# Altium footprint library 模块.PcbLib: 20 footprints (part 2 of 2)
Each footprint in its own frame and in the unit in brackets; x right, y up, seen from the top. Pads: shape width x height; smd on the part's side, far side on the other; paste and mask are expansions set on the pad; w line width, h text height; cw(c..) or ccw(c..) is an arc to the next point about the centre after c.
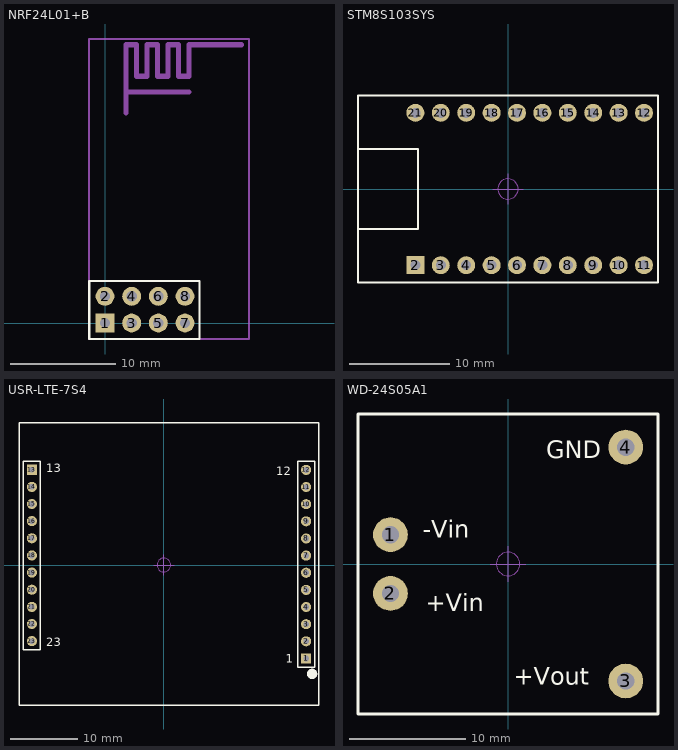
[diagram p1: the footprints below, top view; thin cyan lines are the x and y axes]

## NRF24L01+B [mm] "2.4G无线模块"
pads (8):
  rect 1.8x1.8 hole 1: 1(0,0)
  round 1.8 hole 1: 2(0,2.54) 3(2.54,0) 4(2.54,2.54) 5(5.08,0) 6(5.08,2.54) 7(7.62,0) 8(7.62,2.54)
Top Overlay:
  lines w0.203: -1.5,-1.5 -1.5,4 9,4 9,-1.524 -1.476,-1.524 -1.5,-1.5
Mechanical 15:
  lines w0.203: -1.524,-1.524 13.716,-1.524 13.716,27.051 -1.524,27.051 -1.524,-1.524
  lines w0.5: 2,20 2,26.5 3,26.5 3,23.5 4,23.5 4,26.5 5,26.5 5,23.5 6,23.5 6,26.5 7,26.5 7,23.5 8,23.5 8,26.5 13,26.5 ; 2,22 8,22
3D body: height 15.44, standoff -3.03, extent -1.5,-1.5 13.7,27

## STM8S103SYS [mm] "STM8S103核心板"
pads (20):
  rect 1.8x1.8 hole 1 unplated: 2(-9.26,-7.62)
  round 1.8 hole 1 unplated: 3(-6.72,-7.62) 4(-4.18,-7.62) 5(-1.64,-7.62) 6(0.9,-7.62) 7(3.44,-7.62) 8(5.98,-7.62) 9(8.52,-7.62) 10(11.06,-7.62) 11(13.6,-7.62) 12(13.6,7.62) 13(11.06,7.62) 14(8.52,7.62) 15(5.98,7.62) 16(3.44,7.62) 17(0.9,7.62) 18(-1.64,7.62) 19(-4.18,7.62) 20(-6.72,7.62) 21(-9.26,7.62)
Top Overlay:
  lines w0.203: -15,-4 -9,-4 -9,4 -15,4 ; -15,-9.35 15,-9.35 15,9.35 -15,9.35 -15,-9.35
Mechanical 15:
  circle w0.1: c0,0 r1.016
  lines w0.1: -1.524,0 1.524,0 ; 0,-1.524 0,1.524
3D body: height 6.33, standoff -6.01, extent -15,-9.35 15,9.35

## USR-LTE-7S4 [mm] "全网通4G DTU透传模块"
pads (23):
  rect 1.5x1.5 hole 0.85: 1(21.082,-13.843) 13(-19.558,14.122)
  round 1.5 hole 0.85: 2(21.082,-11.303) 3(21.082,-8.763) 4(21.082,-6.223) 5(21.082,-3.683) 6(21.082,-1.143) 7(21.082,1.397) 8(21.082,3.937) 9(21.082,6.477) 10(21.082,9.017) 11(21.082,11.557) 12(21.082,14.097) 14(-19.558,11.582) 15(-19.558,9.042) 16(-19.558,6.502) 17(-19.558,3.962) 18(-19.558,1.422) 19(-19.558,-1.118) 20(-19.558,-3.658) 21(-19.558,-6.198) 22(-19.558,-8.738) 23(-19.558,-11.278)
Top Overlay:
  circle w0.762: c21.971,-16.129 r0.381
  lines w0.2: -20.828,-12.548 -20.828,13.487 -20.828,15.392 -18.288,15.392 -18.288,-12.548 -20.828,-12.548 ; 19.812,-15.113 22.352,-15.113 22.352,-13.208 22.352,15.367 19.812,15.367 19.812,-15.113
  lines w0.203: -21.463,-20.748 22.987,-20.748 22.987,21.052 -21.463,21.052 -21.463,-20.748
  text "23" at -17.399,-12.065 h1.27
  text "13" at -17.398,13.716 h1.27
  text "12" at 16.637,13.335 h1.27
  text "1" at 18.034,-14.478 h1.27
Mechanical 15:
  circle w0.1: c0,0 r1.016
  lines w0.1: -1.524,0 1.524,0 ; 0,-1.524 0,1.524

## WD-24S05A1 [mm] "3W-24V转5V模块"
pads (4):
  round 3 hole 1.5: 1(-10.15,2.538) 2(-10.15,-2.542) 3(10.17,-10.102) 4(10.17,10.098)
Top Overlay:
  lines w0.254: -12.954,-12.954 12.954,-12.954 12.954,12.954 -12.954,12.954 -12.954,-12.954
  text "+Vout" at 0.508,-10.414 h1.52
  text "GND" at 3.302,9.144 h1.52
  text "-Vin" at -7.366,2.286 h1.52
  text "+Vin" at -7.112,-4.064 h1.52
Mechanical 15:
  circle w0.1: c0,0 r1.016
  lines w0.1: -1.524,0 1.524,0 ; 0,-1.524 0,1.524
3D body: height 8.6, standoff -3.1, extent -12.75,-12.75 12.75,12.75